# Altium footprint library PERCRO_footprints.PcbLib: 177 footprints (part 4 of 12)
Each footprint in its own frame and in the unit in brackets; x right, y up, seen from the top. Pads: shape width x height; smd on the part's side, far side on the other; paste and mask are expansions set on the pad; w line width, h text height; cw(c..) or ccw(c..) is an arc to the next point about the centre after c.
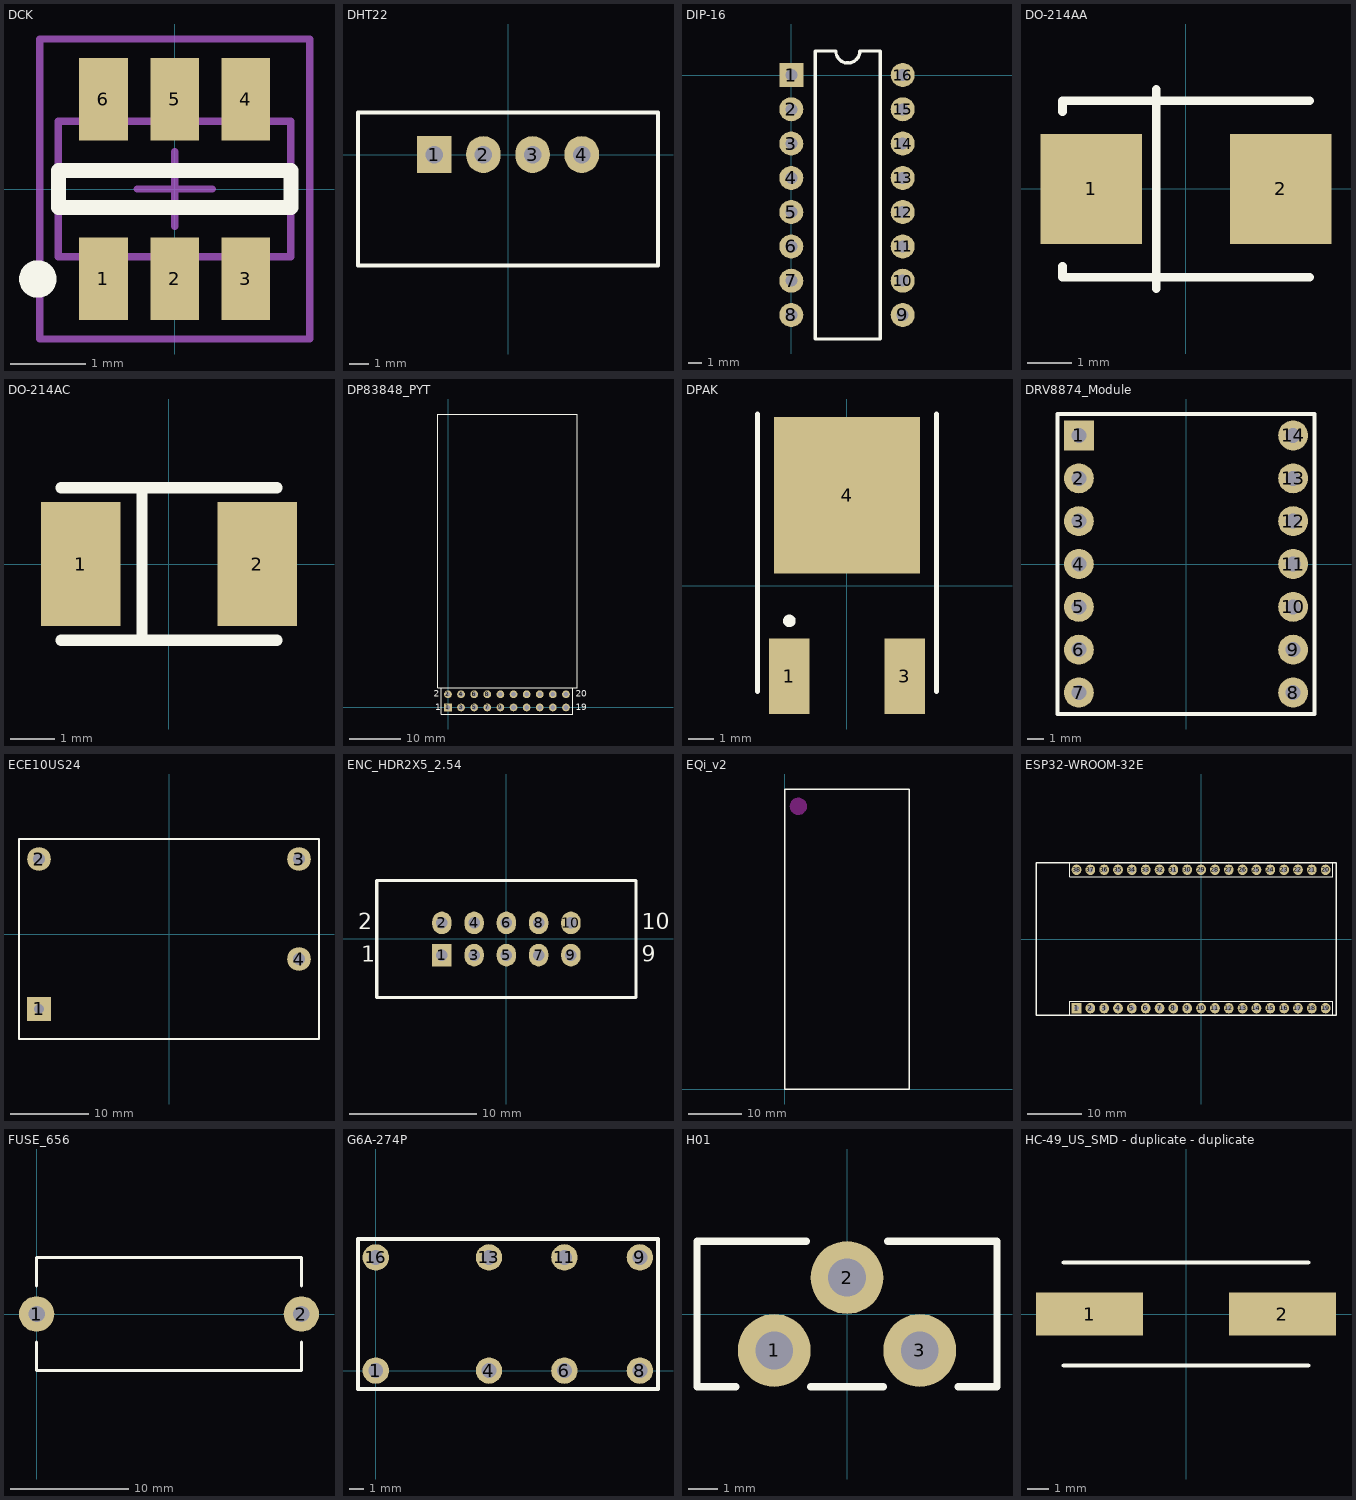
[diagram p3: the footprints below, top view; thin cyan lines are the x and y axes]

## DCK [mm] "Small-Outline Package (SOP)"
height 1.45
pads (6):
  rect 0.65x1.1 smd: 1(-0.95,-1.2) 2(0,-1.2) 3(0.95,-1.2) 4(0.95,1.2) 5(0,1.2) 6(-0.95,1.2)
Top Overlay:
  circle w0.25: c-1.825,-1.2 r0.125
  lines w0.2: -1.55,-0.25 1.55,-0.25 1.55,0.25 -1.55,0.25 -1.55,-0.25
Mechanical 13:
  lines w0.1: -1.55,-0.9 -1.55,0.9 1.55,0.9 1.55,-0.9 -1.55,-0.9
Mechanical 15:
  lines w0.1: -0.5,0 0.5,0 ; 0,-0.5 0,0.5 ; -1.8,-2 -1.8,2 1.8,2 1.8,-2 -1.8,-2
3D body: height 1.45, standoff 0, extent -1.55,-0.9 1.55,0.9

## DHT22 [mil] "Sensor humedad y temperatura"
height 996.06
pads (4):
  rect 70x75 hole 35.43: 1(-150,0)
  oval 70x75 hole 35.43: 2(-50,0) 3(50,0) 4(150,0)
Top Overlay:
  lines w7.87: -305.12,-225.59 305.12,-225.59 305.12,85.43 -305.12,85.43 -305.12,-225.59
3D body "User Library-DHT22.step": height 988.19, standoff -334.65, extent -297.24,-232 297.24,83.35

## DIP-16 [mil]
pads (16):
  rect 70x70 hole 35: 1(0,0)
  round 70 hole 35: 2(0,-100) 3(0,-200) 4(0,-300) 5(0,-400) 6(0,-500) 7(0,-600) 8(0,-700) 9(325,-700) 10(325,-600) 11(325,-500) 12(325,-400) 13(325,-300) 14(325,-200) 15(325,-100) 16(325,0)
Top Overlay:
  lines w10: 70,-770 260,-770 260,70 200,70 cw(c165,70) 130,70 70,70 70,-770
3D body: height 195, standoff 0, extent 70,-770 260,70

## DO-214AA [mm]
pads (2):
  rect 2.3x2.5 smd: 1(-2.15,0) 2(2.15,0)
Top Overlay:
  lines w0.2: -2.8,-1.75 -2.8,-2 2.8,-2 ; -2.8,1.75 -2.8,2 2.8,2 ; -0.673,-2.254 -0.673,2.254
3D body "DO-214AA.step": height 2.62, standoff 0, extent -2.75,-1.9 2.75,1.9

## DO-214AC [mm]
pads (2):
  rect 1.8x2.8 smd: 1(-2,0) 2(2,0)
Top Overlay:
  lines w0.254: -2.45,-1.727 2.45,-1.727 ; -2.45,1.727 2.45,1.727 ; -0.61,-1.727 -0.61,1.727
3D body: height 1.7, standoff 0, extent -2.464,-1.727 2.464,1.727

## DP83848_PYT [mm]
pads (20):
  rect 1.5x1.5 hole 0.9: 1(-0.076,0)
  round 1.5 hole 0.9: 2(-0.076,2.54) 3(2.464,0) 4(2.464,2.54) 5(5.004,0) 6(5.004,2.54) 7(7.544,0) 8(7.544,2.54) 9(10.084,0) 10(10.084,2.54) 11(12.624,0) 12(12.624,2.54) 13(15.164,0) 14(15.164,2.54) 15(17.704,0) 16(17.704,2.54) 17(20.244,0) 18(20.244,2.54) 19(22.784,0) 20(22.784,2.54)
Top Overlay:
  lines w0.2: -1.346,3.81 -1.346,-1.27 24.054,-1.27 24.054,3.81
  lines w0.203: -2.07,3.81 -2.07,56.81 24.93,56.81 24.93,3.81 -2.07,3.81
  text "20" at 24.638,2.032 h1.27
  text "19" at 24.638,-0.508 h1.27
  text "1" at -2.54,-0.508 h1.27
  text "2" at -2.794,2.032 h1.27

## DPAK [mm]
pads (3):
  rect 1.6x3 smd: 1(-2.285,-3.59) 3(2.285,-3.59)
  rect 5.8x6.2 smd: 4(0,3.59)
Top Overlay:
  circle w0.25: c-2.286,-1.397 r0.125
  lines w0.2: -3.556,-4.191 -3.556,6.809 ; 3.556,-4.191 3.556,6.809
3D body "DPAK_TO-252AA.step": height 2.4, standoff 0, extent -3.367,-3.937 3.367,6.163

## DRV8874_Module [mil]
pads (14):
  rect 70x70 hole 35: 1(-250,300)
  round 70 hole 35: 2(-250,200) 3(-250,100) 4(-250,0) 5(-250,-100) 6(-250,-200) 7(-250,-300) 8(250,-300) 9(250,-200) 10(250,-100) 11(250,0) 12(250,100) 13(250,200) 14(250,300)
Top Overlay:
  lines w10: -300,-350 -300,350 300,350 300,-350 -300,-350
3D body "drv887x-single-brushed-dc-motor-driver-carrier.step": height 70.87, standoff -40, extent -300,-350 300,350

## ECE10US24 [mm] "AC to DC converter"
pads (4):
  rect 3x3 hole 1.3: 1(-16.51,-9.525)
  round 3 hole 1.5: 2(-16.51,9.525) 3(16.51,9.525) 4(16.51,-3.175)
Top Overlay:
  lines w0.254: -16.51,12.065 -19.05,12.065 ; -19.05,12.065 -19.05,-13.335 19.05,-13.335 19.05,12.065 -19.05,12.065
3D body: height 15.24, standoff 0, extent -19.05,-13.335 19.05,12.065

## ENC_HDR2X5_2.54 [mil] "MALE CONNECTOR ENCODER"
pads (10):
  rect 60x70 hole 35.43: 1(-200,-50)
  oval 60x70 hole 35.43: 2(-200,50) 3(-100,-50) 4(-100,50) 5(0,-50) 6(0,50) 7(100,-50) 8(100,50) 9(200,-50) 10(200,50)
Top Overlay:
  lines w10: -401.57,-181.1 -401.57,181.1 401.57,181.1 401.57,-181.1 -401.57,-181.1
  text "2" at -460,30 h50
  text "1" at -450,-70 h50
  text "9" at 420,-70 h50
  text "10" at 420,30 h50
3D body "IDC_Socket_Male_10.STEP": height 350.39, standoff -137.8, extent -399.6,-167.31 399.62,181.11

## EQi_v2 [mil]
Top Overlay:
  lines w10: 0,0 0,2216 919,2216 919,0 0,0
Keep-Out Layer:
  board cut-out: 40.94,2088 40.94,2082.18 43.21,2070.77 47.67,2060.03 54.13,2050.35 62.35,2042.13 72.03,2035.67 82.77,2031.21 94.18,2028.94 100,2028.94 105.82,2028.94 117.23,2031.21 127.97,2035.67 137.65,2042.13 145.87,2050.35 152.33,2060.03 156.79,2070.77 159.06,2082.18 159.06,2088 159.06,2093.82 156.79,2105.23 152.33,2115.97 145.87,2125.65 137.65,2133.87 127.97,2140.33 117.23,2144.79 105.82,2147.06 100,2147.06 94.18,2147.06 82.77,2144.79 72.03,2140.33 62.35,2133.87 54.13,2125.65 47.67,2115.97 43.21,2105.23 40.94,2093.82
Keep-Out Layer:
  circle w10: c100,2088 r59.06
3D body "EQi–V2.STEP": height 578.74, standoff 118.11, extent 3.49,25.32 909,2190.68

## ESP32-WROOM-32E [mil]
pads (38):
  rect 70x75 hole 35.43: 1(-900,-500)
  oval 70x75 hole 35.43: 2(-800,-500) 3(-700,-500) 4(-600,-500) 5(-500,-500) 6(-400,-500) 7(-300,-500) 8(-200,-500) 9(-100,-500) 10(0,-500) 11(100,-500) 12(200,-500) 13(300,-500) 14(400,-500) 15(500,-500) 16(600,-500) 17(700,-500) 18(800,-500) 19(900,-500) 20(900,500) 21(800,500) 22(700,500) 23(600,500) 24(500,500) 25(400,500) 26(300,500) 27(200,500) 28(100,500) 29(0,500) 30(-100,500) 31(-200,500) 32(-300,500) 33(-400,500) 34(-500,500) 35(-600,500) 36(-700,500) 37(-800,500) 38(-900,500)
Top Overlay:
  lines w7.87: -950,-549.21 -950,-450 950,-450 950,-550 ; -950,550 -950,450 950,450 950,550 ; 575,-450 583.33,-450
  lines w10: -949.21,549.21 975,549.21 975,0 975,-549.21 -950,-549.21 -1192.91,-549.21 -1192.91,0 -1192.91,549.21 -948.82,549.21
3D body "ESP32-DEVKITC-32D.STEP": height 263.39, standoff -236.22, extent -1192.91,-549.99 976.38,550.01

## FUSE_656 [mm] "FUSE_HOLDER"
pads (2):
  round 3 hole 1.4: 1(0,0) 2(22.5,0)
Top Overlay:
  lines w0.254: 0,-2.4 0,-4.8 22.5,-4.8 22.5,-2.4 ; 0,2.4 0,4.8 22.5,4.8 22.5,2.4
3D body "FH-101-1.STEP": height 10.4, standoff -4.6, extent -0.907,-4.801 23.393,4.799

## G6A-274P [mil] "Relay OMRON"
pads (8):
  round 70 hole 39.37: 1(0,0) 4(300,0) 6(500,0) 8(700,0) 9(700,300) 11(500,300) 13(300,300) 16(0,300)
Top Overlay:
  lines w10: -47.24,-48.82 748.03,-48.82 748.03,348.82 -47.24,348.82 -47.24,-48.82
3D body: height 314.96, standoff 0, extent -47.24,-48.82 748.03,351.18

## H01 [mm] "Trimmer"
pads (3):
  round 2.5 hole 1.3: 1(-2.5,-1.25) 2(0,1.25) 3(2.5,-1.25)
Top Overlay:
  lines w0.254: -3.81,-2.5 -5.15,-2.5 -5.15,2.5 -1.397,2.5 ; -1.25,-2.5 1.25,-2.5 ; 1.397,2.5 5.15,2.5 5.15,-2.5 3.81,-2.5

## HC-49_US_SMD - duplicate - duplicate [mm] "XTAL SMD"
pads (2):
  rect 5x2 smd: 1(-4.5,0) 2(4.5,0)
Top Overlay:
  lines w0.203: -5.7,-2.4 5.7,-2.4 ; -5.7,2.4 5.7,2.4
3D body "Crystal_HC49_US-SM.step": height 4.3, standoff 0, extent -6.4,-2.415 6.4,2.415